# Altium footprint library 68711814522.PcbLib: 1 footprints
Each footprint in its own frame and in the unit in brackets; x right, y up, seen from the top. Pads: shape width x height; smd on the part's side, far side on the other; paste and mask are expansions set on the pad; w line width, h text height; cw(c..) or ccw(c..) is an arc to the next point about the centre after c.
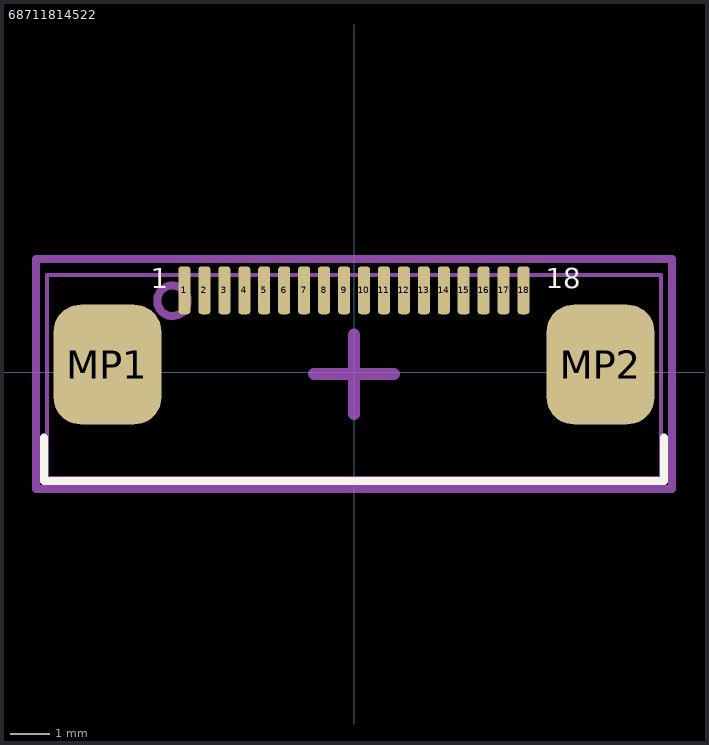
[diagram p0: the footprint, top view; thin cyan lines are the x and y axes]

## 68711814522 [mm] "ZIF Connectors, Horizontal, Bottom Contact, pitch 0.5mm, 18p"
height 2.25
pads (20):
  rrect50% 0.3x1.2 smd: 1(-4.25,2.055) 2(-3.75,2.055) 3(-3.25,2.055) 4(-2.75,2.055) 5(-2.25,2.055) 6(-1.75,2.055) 7(-1.25,2.055) 8(-0.75,2.055) 9(-0.25,2.055) 10(0.25,2.055) 11(0.75,2.055) 12(1.25,2.055) 13(1.75,2.055) 14(2.25,2.055) 15(2.75,2.055) 16(3.25,2.055) 17(3.75,2.055) 18(4.25,2.055)
  rrect50% 2.7x3 smd: MP1(-6.18,0.195) MP2(6.18,0.195)
Top Overlay:
  lines w0.2: -7.775,-1.63 -7.775,-2.73 7.775,-2.73 7.775,-1.63
  text "18" at 4.8,2.105 h0.5
  text "1" at -5.1,2.105 h0.5
Top Courtyard:
  lines w0.2: -7.975,-2.93 7.975,-2.93 7.975,2.838 7.968,2.845 -7.975,2.845 -7.975,-2.93
  lines w0.3: -1,-0.043 1,-0.043 ; 0,-1.048 0,0.952
Top Assembly:
  circle w0.2: c-4.55,1.795 r0.382
  lines w0.1: -7.7,-2.63 -7.7,2.445 7.7,2.445 7.7,-2.655 -7.675,-2.655 -7.7,-2.63
3D body "68711814522.stp": height 2.1, standoff 0, extent -7.7,-2.655 7.7,2.445